# Altium footprint library IC.PcbLib: 163 footprints (part 11 of 11)
Each footprint in its own frame and in the unit in brackets; x right, y up, seen from the top. Pads: shape width x height; smd on the part's side, far side on the other; paste and mask are expansions set on the pad; w line width, h text height; cw(c..) or ccw(c..) is an arc to the next point about the centre after c.
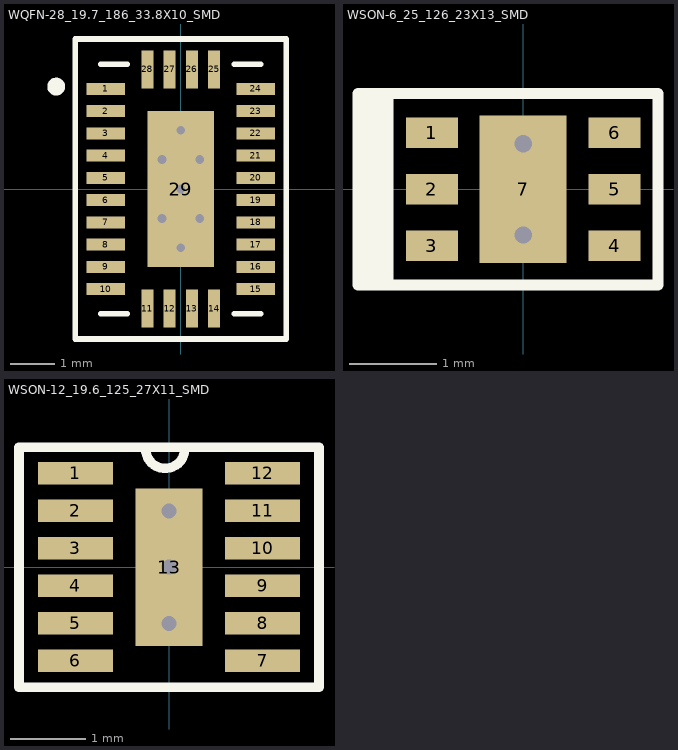
[diagram p10: the footprints below, top view; thin cyan lines are the x and y axes]

## WQFN-28_19.7_186_33.8X10_SMD [mm] "WQFN Package"
height 0.8
pads (29):
  rect 0.86x0.27 smd: 1(-1.685,2.25) 2(-1.685,1.75) 3(-1.685,1.25) 4(-1.685,0.75) 5(-1.685,0.25) 6(-1.685,-0.25) 7(-1.685,-0.75) 8(-1.685,-1.25) 9(-1.685,-1.75) 10(-1.685,-2.25) 15(1.685,-2.25) 16(1.685,-1.75) 17(1.685,-1.25) 18(1.685,-0.75) 19(1.685,-0.25) 20(1.685,0.25) 21(1.685,0.75) 22(1.685,1.25) 23(1.685,1.75) 24(1.685,2.25)
  rect 0.27x0.86 smd: 11(-0.75,-2.685) 12(-0.25,-2.685) 13(0.25,-2.685) 14(0.75,-2.685) 25(0.75,2.685) 26(0.25,2.685) 27(-0.25,2.685) 28(-0.75,2.685)
  rect 1.5x3.5 smd: 29(0,0)
via 0,1.32 diameter 0.4 hole 0.2
via 0,-1.32 diameter 0.4 hole 0.2
via 0,0 diameter 0.4 hole 0.2
via -0.425,0.66 diameter 0.4 hole 0.2
via -0.425,-0.66 diameter 0.4 hole 0.2
via 0.425,-0.66 diameter 0.4 hole 0.2
via 0.425,0.66 diameter 0.4 hole 0.2
Top Overlay:
  circle w0.2: c-2.8,2.3 r0.1
  lines w0.125: -2.37,-3.37 2.37,-3.37 2.37,3.37 -2.37,3.37 -2.37,-3.37
  lines w0.127: -1.8,-2.8 -1.2,-2.8 ; -1.8,2.8 -1.2,2.8 ; 1.2,-2.8 1.8,-2.8 ; 1.2,2.8 1.8,2.8
Top Paste:
  region: 0.16,1.69 0.69,1.69 0.69,0.16 0.16,0.16
  region: 0.16,-0.16 0.69,-0.16 0.69,-1.69 0.16,-1.69
  region: -0.69,1.69 -0.16,1.69 -0.16,0.16 -0.69,0.16
  region: -0.69,-0.16 -0.16,-0.16 -0.16,-1.69 -0.69,-1.69

## WSON-6_25_126_23X13_SMD [mm] "diode"
height 0.8
pads (7):
  rect 0.6x0.35 smd mask+0.076: 1(-1.05,0.65) 2(-1.05,0) 3(-1.05,-0.65) 4(1.05,-0.65) 5(1.05,0) 6(1.05,0.65)
  rect 1x1.7 smd mask+0.076: 7(0,0)
via 0,0.525 diameter 0.4 hole 0.2
via 0,-0.525 diameter 0.4 hole 0.2
Top Overlay:
  rectangle: -1.85,-1.118 -1.494,1.125
  lines w0.127: -1.1,1.1 1.55,1.1 1.55,-1.1 -1.9,-1.1 -1.9,1.1 -0.9,1.1
3D body "TVS3300DRVR.stp": height 0.8, standoff 0, extent -1.05,-1 1.05,1

## WSON-12_19.6_125_27X11_SMD [mm] "CASE: WSON"
height 0.8
pads (13):
  rect 1x0.3 smd mask+0.076: 1(-1.25,1.25) 2(-1.25,0.75) 3(-1.25,0.25) 4(-1.25,-0.25) 5(-1.25,-0.75) 6(-1.25,-1.25) 7(1.25,-1.25) 8(1.25,-0.75) 9(1.25,-0.25) 10(1.25,0.25) 11(1.25,0.75) 12(1.25,1.25)
  rect 0.889x2.1 smd mask+0.076: 13(0,0)
via 0,0.75 diameter 0.4 hole 0.2
via 0,-0.75 diameter 0.4 hole 0.2
via 0,0 diameter 0.4 hole 0.2
Top Overlay:
  lines w0.127: -0.307,1.535 ccw(c-0.051,1.575) 0.204,1.528 ; -2,-1.6 -2,1.6 2,1.6 2,-1.6 -2,-1.6
3D body "DRV8835DSSR.stp": height 0.8, standoff 0, extent -1.05,-1.5 1.05,1.5